# Altium footprint library PBL - THD Packages.PcbLib: 256 footprints (part 13 of 16)
Each footprint in its own frame and in the unit in brackets; x right, y up, seen from the top. Pads: shape width x height; smd on the part's side, far side on the other; paste and mask are expansions set on the pad; w line width, h text height; cw(c..) or ccw(c..) is an arc to the next point about the centre after c.
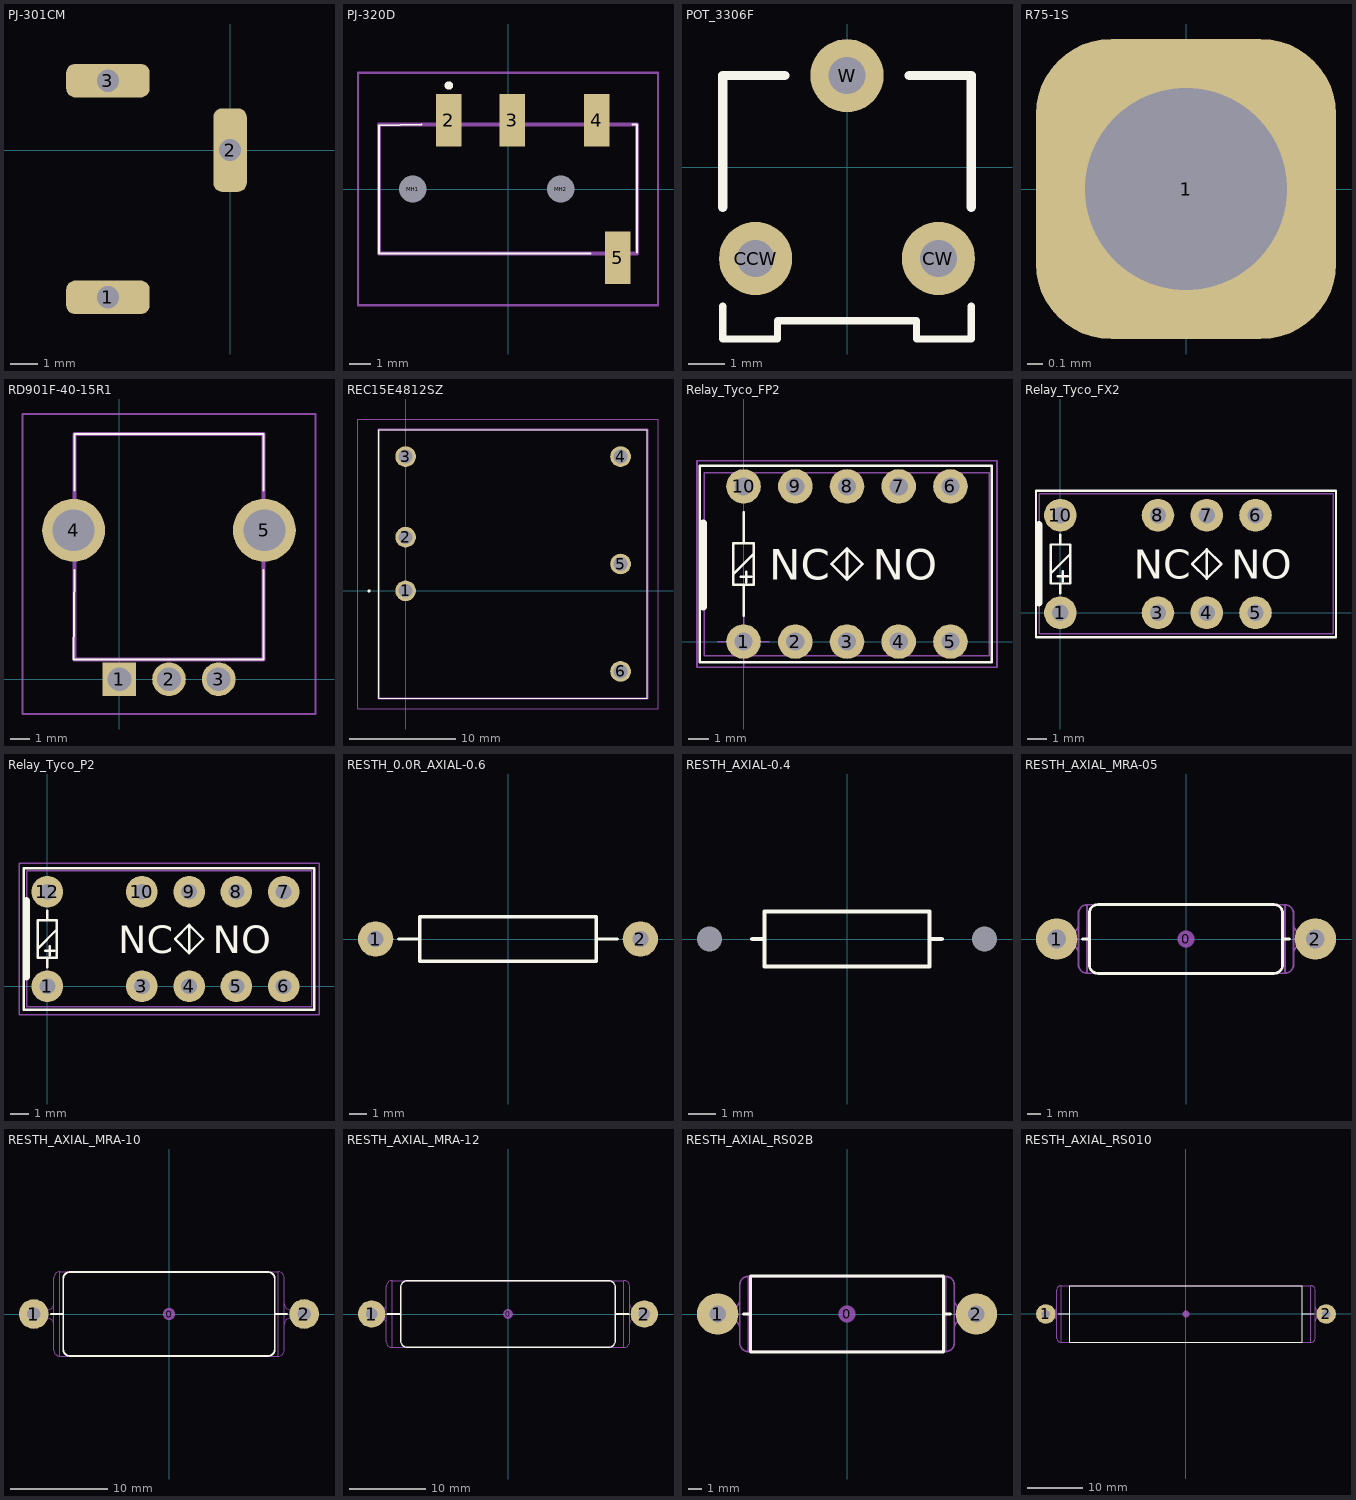
[diagram p12: the footprints below, top view; thin cyan lines are the x and y axes]

## PJ-301CM [mm] "3.5 mm audio jack straight"
pads (3):
  rrect50% 3x1.2 hole 0.8 square: 1(-4.4,-5.3) 3(-4.4,2.5)
  rrect50% 1.2x3 hole 0.8 square: 2(0,0)
3D body: height 10, standoff 0, extent -8.45,-6.5 0.05,3.7

## PJ-320D [mm] "3.5 mm audio jack right angle"
pads (6):
  rect 1.2x2.5 smd: 2(-2.8,3.25) 3(0.2,3.25) 4(4.2,3.25) 5(5.2,-3.25)
  round 0.65 hole 1.3 unplated: MH1(-4.5,0) MH2(2.5,0)
Top Overlay:
  lines w0.1: -4.1,3.05 -6.1,3 -6.1,-3 -6.1,-3.05 3.9,-3.05 ; 5.9,3.05 6.1,3.05 6.1,-3
  lines w0.2: -2.9,4.9 ccw(c-2.8,4.9) -2.7,4.9 ccw(c-2.8,4.9) -2.9,4.9
13 - 3D Top Side:
  lines w0.2: -6.1,-3.05 -6.1,3.05 6.1,3.05 6.1,-3.05 -6.1,-3.05
15 - Top Courtyards:
  lines w0.1: -7.1,-5.5 -7.1,5.5 7.1,5.5 7.1,-5.5 -7.1,-5.5
3D body "PJ-320D.stp": height 5.7, standoff -1.7, extent -6.1,-4.38 6.1,4.38

## POT_3306F [mm]
pads (3):
  round 2 hole 1.016: CCW(-2.5,-2.5) CW(2.5,-2.5) W(0,2.5)
Top Overlay:
  lines w0.2: -3.4,-3.8 -3.4,-4.7 -1.9,-4.7 -1.9,-4.2 0,-4.2 1.9,-4.2 1.9,-4.7 3.4,-4.7 3.4,-3.8
  lines w0.254: -3.4,-1.1 -3.4,2.5 -1.7,2.5 ; 1.7,2.5 3.4,2.5 3.4,-1.1
3D body "Trimmer, 3306F.step": height 7.62, standoff -3.04, extent -3.405,-4.876 3.405,3.79

## R75-1S [mm] "R75-1S pogo pin housing"
pads (1):
  rrect50% 2x2 hole 1.35 mask+0.05: 1(0,0)

## RD901F-40-15R1 [mm] "Potentiometer"
pads (5):
  rect 1.7x1.7 hole 1.2: 1(0,0)
  round 1.7 hole 1.2: 2(2.5,0) 3(5,0)
  round 3.164 hole 2.11: 4(-2.3,7.5) 5(7.3,7.5)
Top Overlay:
  lines w0.1: -2.25,5.5 -2.3,1 7.25,1 7.25,5.5 ; -2.25,9.5 -2.25,12.35 7.25,12.35 7.25,9.5
13 - 3D Top Side:
  lines w0.2: -2.25,1 -2.25,12.35 7.25,12.35 7.25,1 -2.25,1
15 - Top Courtyards:
  lines w0.1: -4.882,-1.75 -4.882,13.35 9.882,13.35 9.882,-1.75 -4.882,-1.75
3D body "RD901F-40-15R1.step": height 25, standoff -3.5, extent -3.361,-0.15 8.361,12.35

## REC15E4812SZ [mm]
pads (6):
  round 1.95 hole 1.3: 1(0,0) 2(0,5.08) 3(0,12.7) 4(20.32,12.7) 5(20.32,2.54) 6(20.32,-7.62)
Top Overlay:
  lines w0.1: -2.54,-10.16 22.86,-10.16 22.86,15.24 -2.54,15.24 -2.54,-10.16
  lines w0.2: -3.5,0 ccw(c-3.45,0) -3.4,0 ; -3.5,0 cw(c-3.45,0) -3.4,0 ; -3.5,0 ccw(c-3.45,0) -3.4,0
13 - 3D Top Side:
  lines w0.2: -2.54,-10.16 22.86,-10.16 22.86,15.24 -2.54,15.24 -2.54,-10.16
15 - Top Courtyards:
  lines w0.1: -4.5,-11.16 23.86,-11.16 23.86,16.24 -4.5,16.24 -4.5,-11.16
3D body "REC15E-4812SZ.stp": height 10.06, standoff -5.54, extent -2.77,-10.31 22.93,15.39

## Relay_Tyco_FP2 [mm] "Tyco FP2 DPDT 5VDC Relay"
height 5.1
pads (10):
  round 1.7 hole 0.889: 1(0,0) 2(2.54,0) 3(5.08,0) 4(7.62,0) 5(10.16,0) 6(10.16,7.62) 7(7.62,7.62) 8(5.08,7.62) 9(2.54,7.62) 10(0,7.62)
Top Overlay:
  lines w0.127: -0.508,3.302 0.508,4.318 ; -0.127,3.175 0.381,3.175 ; 0,1.27 0,2.794 ; 0,4.826 0,6.35 ; 0.127,2.921 0.127,3.429 ; 5.08,3.048 4.318,3.81 5.08,4.572 ; 5.08,3.048 5.08,4.572 ; 5.08,3.048 5.842,3.81 5.08,4.572 ; -2.159,-1.016 -2.159,8.636 12.192,8.636 12.192,-1.016 -2.159,-1.016 ; -0.508,2.794 0.508,2.794 0.508,4.826 -0.508,4.826 -0.508,2.794
  lines w0.381: -1.981,1.727 -1.981,5.817
  text "NC" at 1.27,3.048 h1.5
  text "NO" at 6.35,3.048 h1.5
13 - 3D Top Side:
  lines w0.076: -1.93,-0.7 12.07,-0.7 12.07,8.3 -1.93,8.3 -1.93,-0.7
15 - Top Courtyards:
  lines w0.076: -1.27,0 1.27,0 ; 0,-1.27 0,1.27 ; -2.286,-1.27 12.446,-1.27 12.446,8.89 -2.286,8.89 -2.286,-1.27
3D body: height 5, standoff 0.3, extent -1.93,-0.7 12.07,8.3

## Relay_Tyco_FX2 [mm] "Tyco FX2 DPDT 5VDC Relay"
height 10.7
pads (8):
  round 1.7 hole 0.85: 1(0,0) 3(5.08,0) 4(7.62,0) 5(10.16,0) 6(10.16,5.08) 7(7.62,5.08) 8(5.08,5.08) 10(0,5.08)
Top Overlay:
  lines w0.127: -0.508,2.032 0.508,3.048 ; -0.127,1.905 0.381,1.905 ; 0,1.016 0,1.524 ; 0,3.556 0,4.064 ; 0.127,1.651 0.127,2.159 ; 7.62,1.778 6.858,2.54 7.62,3.302 ; 7.62,1.778 7.62,3.302 ; 7.62,1.778 8.382,2.54 7.62,3.302 ; -1.27,-1.27 -1.27,6.35 14.351,6.35 14.351,-1.27 -1.27,-1.27 ; -0.508,1.524 0.508,1.524 0.508,3.556 -0.508,3.556 -0.508,1.524
  lines w0.381: -1.118,0.508 -1.118,4.597
  text "NC" at 3.81,1.778 h1.5
  text "NO" at 8.89,1.778 h1.5
13 - 3D Top Side:
  lines w0.076: -1.1,-1.1 -1.1,6.2 14.2,6.2 14.2,-1.1 -1.1,-1.1
3D body: height 10.7, standoff 0, extent -1.1,-1.1 14.2,6.2

## Relay_Tyco_P2 [mm] "Tyco P2 DPDT 5VDC V23079 Relay"
height 10
pads (10):
  round 1.7 hole 0.85: 1(0,0) 3(5.08,0) 4(7.62,0) 5(10.16,0) 6(12.7,0) 7(12.7,5.08) 8(10.16,5.08) 9(7.62,5.08) 10(5.08,5.08) 12(0,5.08)
Top Overlay:
  lines w0.127: -0.508,2.032 0.508,3.048 ; -0.127,1.905 0.381,1.905 ; 0,1.016 0,1.524 ; 0,3.556 0,4.064 ; 0.127,1.651 0.127,2.159 ; 7.62,1.778 6.858,2.54 7.62,3.302 ; 7.62,1.778 7.62,3.302 ; 7.62,1.778 8.382,2.54 7.62,3.302 ; -1.27,-1.27 -1.27,6.35 14.351,6.35 14.351,-1.27 -1.27,-1.27 ; -0.508,1.524 0.508,1.524 0.508,3.556 -0.508,3.556 -0.508,1.524
  lines w0.381: -1.118,0.508 -1.118,4.597
  text "NC" at 3.81,1.778 h1.5
  text "NO" at 8.89,1.778 h1.5
13 - 3D Top Side:
  lines w0.076: -1.1,-1.1 -1.1,6.2 14.2,6.2 14.2,-1.1 -1.1,-1.1
15 - Top Courtyards:
  lines w0.076: -0.762,0 0.762,0 ; 0,-0.762 0,0.762 ; -1.524,-1.524 -1.524,6.604 14.6,6.604 14.6,-1.524 -1.524,-1.524
3D body "c-1393788-3-a5-3d.stp": height 9.82, standoff -0.58, extent -0.9,-1.14 13.6,6.26
3D body: height 10.7, standoff 0, extent -1.1,-1.1 14.2,6.2

## RESTH_0.0R_AXIAL-0.6 [mil] "Axial Resistor 0 Ohm, Thru-Hole; 2 Leads; 0.6 in Pin Spacing"
height 102.36
pads (2):
  round 80 hole 36: 1(-300,0) 2(300,0)
Top Overlay:
  lines w7.87: -248.03,0 -200,0 ; 200,0 248.03,0 ; -200,-50 200,-50 200,50 -200,50 -200,-50
3D body "Res_Axial_0.6.STEP": height 102.76, standoff -98.43, extent -311.8,-51.57 311.82,51.58

## RESTH_AXIAL-0.4 [mil]
height 80
pads (2):
  round 0 / inner round 0 / far side round 100 hole 36 unplated: 1(-200,0) 2(200,0)
Top Overlay:
  lines w6: -137.8,0 -120,0 ; 120,0 137.8,0 ; -120,-40 -120,40 120,40 120,-40 -120,-40
3D body "RESTH_Axial-0.4.STEP": height 102.23, standoff -100, extent -211.81,-50.27 211.81,50.27

## RESTH_AXIAL_MRA-05 [mil] "MRA-05 Axial Resistor Thru-Hole; 2 Leads"
height 198
pads (3):
  round 50 on Mech15: 0(0,0)
  round 120 hole 54: 1(-375,0) 2(375,0)
Top Overlay:
  lines w7.87: -300,0 -280,0 ; 280,0 300,0 ; -280,-75 ccw(c-255,-75) -255,-100 255,-100 ccw(c255,-75) 280,-75 280,75 ccw(c255,75) 255,100 -255,100 ccw(c-255,75) -280,75 -280,-75
13 - 3D Top Side:
  lines w5: -337,-16.89 -337,17 ; -312,-42 ccw(c-337,-42) -337,-17 -375,-17 cw(c-375,0) -375,17 -337,17 ; -312,42 cw(c-337,42) -337,17 ; 312,-42 cw(c337,-42) 337,-17 ; 312,42 ccw(c337,42) 337,17 375,17 cw(c375,0) 375,-17 337,-17 ; 337,16.89 337,-17 ; -341,-16.98 -341,-16.52 -341,-15.46 -341,-13.85 -341,-11.73 -341,-9.19 -341,-6.32 -341,-3.22 -341,0 -341,3.22 -341,6.32 -341,9.19 -341,11.73 -341,13.85 -341,15.46 -341,16.52 -341,16.98 ; -341,-17 -341,-16.98 ; -341,16.98 -341,17 ; -287,-99 cw(c-287,-74) -312,-74 -312,74 cw(c-287,74) -287,99 ; -287,-99 -287,99 ; -287,-99 287,-99 ; -287,99 287,99 ; 287,-99 ccw(c287,-74) 312,-74 312,74 ccw(c287,74) 287,99 ; 287,-99 287,99 ; 341,-16.98 341,-16.52 341,-15.46 341,-13.85 341,-11.73 341,-9.19 341,-6.32 341,-3.22 341,0 341,3.22 341,6.32 341,9.19 341,11.73 341,13.85 341,15.46 341,16.52 341,16.98 ; 341,-17 341,-16.98 ; 341,16.98 341,17
3D body "Power Res MRA-05.STEP": height 197.22, standoff -100, extent -391.99,-98.8 392.01,98.81

## RESTH_AXIAL_MRA-10 [mil] "MRA-10 Axial Resistor Thru-Hole; 2 Leads"
height 343
pads (3):
  round 50 on Mech15: 0(0,0)
  round 120 hole 54: 1(-550,0) 2(550,0)
Top Overlay:
  lines w7.87: -480,0 -430,0 ; 430,0 480,0 ; -430,-145 ccw(c-405,-145) -405,-170 405,-170 ccw(c405,-145) 430,-145 430,145 ccw(c405,145) 405,170 -405,170 ccw(c-405,145) -430,145 -430,-145
13 - 3D Top Side:
  lines w5: -516,-17 -516,17 ; -493.5,-16.89 -493.5,17 ; -468.5,-42 ccw(c-493.5,-42) -493.5,-17 -550,-17 cw(c-550,0) -550,17 -493.5,17 ; -468.5,42 cw(c-493.5,42) -493.5,17 ; 468.5,-42 cw(c493.5,-42) 493.5,-17 ; 468.5,42 ccw(c493.5,42) 493.5,17 550,17 cw(c550,0) 550,-17 493.5,-17 ; 493.5,16.89 493.5,-17 ; 516,-17 516,17 ; -443.5,-171.5 cw(c-443.5,-146.5) -468.5,-146.5 -468.5,146.5 cw(c-443.5,146.5) -443.5,171.5 ; -443.5,-171.5 443.5,-171.5 ; -443.5,-171.5 -443.5,171.5 ; -443.5,171.5 443.5,171.5 ; 443.5,-171.5 ccw(c443.5,-146.5) 468.5,-146.5 468.5,146.5 ccw(c443.5,146.5) 443.5,171.5 ; 443.5,-171.5 443.5,171.5
3D body "Power Res MRA-10.STEP": height 341.65, standoff -100, extent -566.99,-171.16 567,171.17

## RESTH_AXIAL_MRA-12 [mil] "MRA-12 Axial Resistor Thru-Hole; 2 Leads"
height 343
pads (3):
  round 50 on Mech15: 0(0,0)
  round 140 hole 60: 1(-700,0) 2(700,0)
Top Overlay:
  lines w7.87: -620,0 -550,0 ; 550,0 620,0 ; -550,-139.99 ccw(c-520,-139.99) -520,-169.99 520,-170 ccw(c519.99,-139.99) 549.99,-139.99 550,140 ccw(c519.99,140) 519.99,170 -520,170 ccw(c-520,140) -550,140 -550,-140
13 - 3D Top Side:
  lines w5: -666,-17 -666,17 ; -625,-47 ccw(c-655,-47) -655,-17 ; -625,47 cw(c-655,47) -655,17 ; 625,-47 cw(c655,-47) 655,-17 ; 625,47 ccw(c655,47) 655,17 ; 666,-17 666,17 ; -655,-17 -655,17 ; -655,-17 -700,-17 cw(c-700,0) -700,17 -655,17 ; -595,-171.5 cw(c-595,-141.5) -625,-141.5 -625,141.5 cw(c-595,141.5) -595,171.5 ; -595,-171.5 -595,171.5 ; -595,-171.5 595,-171.5 ; -595,171.5 595,171.5 ; 595,-171.5 ccw(c595,-141.5) 625,-141.5 625,141.5 ccw(c595,141.5) 595,171.5 ; 595,-171.5 595,171.5 ; 655,-17 655,17 ; 655,-17 700,-17 ccw(c700,0) 700,17 655,17
3D body "Power Res MRA-12.STEP": height 341.65, standoff -100, extent -717,-171.15 717,171.17

## RESTH_AXIAL_RS02B [mil] "Axial Resistor Thru-Hole; 2 Leads"
height 218
pads (3):
  round 50 on Mech15: 0(0,0)
  round 120 hole 48: 1(-375,0) 2(375,0)
Top Overlay:
  lines w7.87: -300,0 -280,0 ; 280,0 300,0 ; -280,-110 280,-110 280,110 -280,110 -280,-110
13 - 3D Top Side:
  lines w5: -341,-17 -341,17 ; -311,-42 ccw(c-336,-42) -336,-17 ; -311,42 cw(c-336,42) -336,17 ; 311,-42 cw(c336,-42) 336,-17 ; 311,42 ccw(c336,42) 336,17 ; 341,-17 341,17 ; -336,-17 -336,17 ; -336,-17 -375,-17 cw(c-375,0) -375,17 -336,17 ; -286,-109 cw(c-286,-84) -311,-84 -311,84 cw(c-286,84) -286,109 ; -286,-109 -286,109 ; -286,-109 286,-109 ; -286,109 286,109 ; 286,-109 ccw(c286,-84) 311,-84 311,84 ccw(c286,84) 286,109 ; 286,-109 286,109 ; 336,-17 336,17 ; 336,-17 375,-17 ccw(c375,0) 375,17 336,17
3D body "Power Res RS02B.STEP": height 217.14, standoff -100, extent -392,-108.78 392,108.79

## RESTH_AXIAL_RS010 [mil] "Axial Resistor Thru-Hole; 2 Leads"
height 406
pads (3):
  round 50 on Mech15: 0(0,0)
  round 140 hole 60: 1(-1000,0) 2(1000,0)
Top Overlay:
  lines w7.87: -910,0 -830,0 ; 830,0 910,0 ; -830,-200 830,-200 830,200 -830,200 -830,-200
13 - 3D Top Side:
  lines w5: -958,-21 -958,21 ; -921,-51 ccw(c-951,-51) -951,-21 ; -921,51 cw(c-951,51) -951,21 ; 921,-51 cw(c951,-51) 951,-21 ; 921,51 ccw(c951,51) 951,21 ; 958,-21 958,21 ; -951,-21 -951,21 ; -951,-21 -1000,-21 cw(c-1000,0) -1000,21 -951,21 ; -891,-203 cw(c-891,-173) -921,-173 -921,173 cw(c-891,173) -891,203 ; -891,-203 -891,203 ; -891,-203 891,-203 ; -891,203 891,203 ; 891,-203 ccw(c891,-173) 921,-173 921,173 ccw(c891,173) 891,203 ; 891,-203 891,203 ; 951,-21 951,21 ; 951,-21 1000,-21 ccw(c1000,0) 1000,21 951,21
3D body "Power Res RS010.STEP": height 404.4, standoff -100, extent -1020.99,-202.59 1021,202.61